# Altium schematic symbol library jlcpcb_2025_04_inductors_extended_0402.schlib: 1396 symbols (part 3 of 8) (continued)
## LQW15AN4N0C10D
designator L?  Inductance: 4nH
Inductor, 4nH, 51mΩ, SMD 0402; Manufacturer: Murata Electronics; Manufacturer Part Number: LQW15AN4N0C10D; Self-Resonant Frequency: 6.5GHz; Q Factor: 30@250MHz; Package Size: 0402; JLCPCB Basic Part: No; JLCPCB Part Number: C412345; Supplier 1: LCSC; Category: Inductors; Supplier Part Number 1: C412345; DC Resistance: 51mΩ; RoHS: Yes; ComponentLink1Description: Datasheet; ComponentLink1URL: https://wmsc.lcsc.com/wmsc/upload/file/pdf/v2/lcsc/2304140030_Murata-Electronics-LQW15AN4N0C10D_C412345.pdf; ComponentLink2Description: JLCPCB Part URL; ComponentLink2URL: https://jlcpcb.com/partdetail/C412345; ComponentLink3Description: LCSC Part URL; ComponentLink3URL: https://lcsc.com/product-detail/Inductors-SMD_Murata-Electronics-Murata-Electronics-LQW15AN4N0C10D_C412345.html
footprint IND-0402 (0402 (1005M) Inductor)
pins: 1, 2

## LQW15AN4N0G80D
designator L?  Inductance: 4nH
Inductor, 4nH, ±2%, 30mΩ, SMD 0402; Manufacturer: Murata Electronics; Manufacturer Part Number: LQW15AN4N0G80D; Self-Resonant Frequency: 10GHz; Q Factor: 30@250MHz; Package Size: 0402; JLCPCB Basic Part: No; JLCPCB Part Number: C412280; Supplier 1: LCSC; Category: Inductors; Supplier Part Number 1: C412280; Tolerance: ±2%; DC Resistance: 30mΩ; RoHS: Yes; ComponentLink1Description: Datasheet; ComponentLink1URL: https://wmsc.lcsc.com/wmsc/upload/file/pdf/v2/lcsc/2304140030_Murata-Electronics-LQW15AN4N0G80D_C412280.pdf; ComponentLink2Description: JLCPCB Part URL; ComponentLink2URL: https://jlcpcb.com/partdetail/C412280; ComponentLink3Description: LCSC Part URL; ComponentLink3URL: https://lcsc.com/product-detail/Inductors-SMD_Murata-Electronics-Murata-Electronics-LQW15AN4N0G80D_C412280.html
footprint IND-0402 (0402 (1005M) Inductor)
pins: 1, 2

## LQW15AN4N1B00D
designator L?  Inductance: 4.1nH
Inductor, 4.1nH, 70mΩ, SMD 0402; Manufacturer: Murata Electronics; Manufacturer Part Number: LQW15AN4N1B00D; Self-Resonant Frequency: 10GHz; Q Factor: 25@250MHz; Package Size: 0402; JLCPCB Basic Part: No; JLCPCB Part Number: C397302; Supplier 1: LCSC; Category: Inductors; Supplier Part Number 1: C397302; DC Resistance: 70mΩ; RoHS: Yes; ComponentLink1Description: Datasheet; ComponentLink1URL: https://wmsc.lcsc.com/wmsc/upload/file/pdf/v2/lcsc/2304140030_Murata-Electronics-LQW15AN4N1B00D_C397302.pdf; ComponentLink2Description: JLCPCB Part URL; ComponentLink2URL: https://jlcpcb.com/partdetail/C397302; ComponentLink3Description: LCSC Part URL; ComponentLink3URL: https://lcsc.com/product-detail/Inductors-SMD_Murata-Electronics-Murata-Electronics-LQW15AN4N1B00D_C397302.html
footprint IND-0402 (0402 (1005M) Inductor)
pins: 1, 2

## LQW15AN4N1G80D
designator L?  Inductance: 4.1nH
Inductor, 4.1nH, ±2%, 44mΩ, SMD 0402; Manufacturer: Murata Electronics; Manufacturer Part Number: LQW15AN4N1G80D; Self-Resonant Frequency: 9.6GHz; Q Factor: 30@250MHz; Package Size: 0402; JLCPCB Basic Part: No; JLCPCB Part Number: C412281; Supplier 1: LCSC; Category: Inductors; Supplier Part Number 1: C412281; Tolerance: ±2%; DC Resistance: 44mΩ; RoHS: Yes; ComponentLink1Description: Datasheet; ComponentLink1URL: https://wmsc.lcsc.com/wmsc/upload/file/pdf/v2/lcsc/2304140030_Murata-Electronics-LQW15AN4N1G80D_C412281.pdf; ComponentLink2Description: JLCPCB Part URL; ComponentLink2URL: https://jlcpcb.com/partdetail/C412281; ComponentLink3Description: LCSC Part URL; ComponentLink3URL: https://lcsc.com/product-detail/Inductors-SMD_Murata-Electronics-Murata-Electronics-LQW15AN4N1G80D_C412281.html
footprint IND-0402 (0402 (1005M) Inductor)
pins: 1, 2

## LQW15AN4N2C10D
designator L?  Inductance: 4.2nH
Inductor, 4.2nH, 51mΩ, SMD 0402; Manufacturer: Murata Electronics; Manufacturer Part Number: LQW15AN4N2C10D; Self-Resonant Frequency: 6.5GHz; Q Factor: 30@250MHz; Package Size: 0402; JLCPCB Basic Part: No; JLCPCB Part Number: C412346; Supplier 1: LCSC; Category: Inductors; Supplier Part Number 1: C412346; DC Resistance: 51mΩ; RoHS: Yes; ComponentLink1Description: Datasheet; ComponentLink1URL: https://wmsc.lcsc.com/wmsc/upload/file/pdf/v2/lcsc/2304140030_Murata-Electronics-LQW15AN4N2C10D_C412346.pdf; ComponentLink2Description: JLCPCB Part URL; ComponentLink2URL: https://jlcpcb.com/partdetail/C412346; ComponentLink3Description: LCSC Part URL; ComponentLink3URL: https://lcsc.com/product-detail/Inductors-SMD_Murata-Electronics-Murata-Electronics-LQW15AN4N2C10D_C412346.html
footprint IND-0402 (0402 (1005M) Inductor)
pins: 1, 2

## LQW15AN4N2D8ZD
designator L?  Inductance: 4.2nH
Inductor, 4.2nH, 44mΩ, 1.8A, SMD 0402; Manufacturer: Murata Electronics; Manufacturer Part Number: LQW15AN4N2D8ZD; Package Size: 0402; JLCPCB Basic Part: No; JLCPCB Part Number: C2043843; Supplier 1: LCSC; Category: Inductors; Supplier Part Number 1: C2043843; Rated Current: 1.8A; DC Resistance: 44mΩ; RoHS: Yes; ComponentLink1Description: Datasheet; ComponentLink1URL: https://wmsc.lcsc.com/wmsc/upload/file/pdf/v2/lcsc/2304140030_Murata-Electronics-LQW15AN4N2D8ZD_C2043843.pdf; ComponentLink2Description: JLCPCB Part URL; ComponentLink2URL: https://jlcpcb.com/partdetail/C2043843; ComponentLink3Description: LCSC Part URL; ComponentLink3URL: https://lcsc.com/product-detail/Power-Inductors_Murata-Electronics-Murata-Electronics-LQW15AN4N2D8ZD_C2043843.html
footprint IND-0402 (0402 (1005M) Inductor)
pins: 1, 2

## LQW15AN4N2G80D
designator L?  Inductance: 4.2nH
Inductor, 4.2nH, ±2%, 44mΩ, SMD 0402; Manufacturer: Murata Electronics; Manufacturer Part Number: LQW15AN4N2G80D; Self-Resonant Frequency: 9.6GHz; Q Factor: 30@250MHz; Package Size: 0402; JLCPCB Basic Part: No; JLCPCB Part Number: C412282; Supplier 1: LCSC; Category: Inductors; Supplier Part Number 1: C412282; Tolerance: ±2%; DC Resistance: 44mΩ; RoHS: Yes; ComponentLink1Description: Datasheet; ComponentLink1URL: https://wmsc.lcsc.com/wmsc/upload/file/pdf/v2/lcsc/2304140030_Murata-Electronics-LQW15AN4N2G80D_C412282.pdf; ComponentLink2Description: JLCPCB Part URL; ComponentLink2URL: https://jlcpcb.com/partdetail/C412282; ComponentLink3Description: LCSC Part URL; ComponentLink3URL: https://lcsc.com/product-detail/Inductors-SMD_Murata-Electronics-Murata-Electronics-LQW15AN4N2G80D_C412282.html
footprint IND-0402 (0402 (1005M) Inductor)
pins: 1, 2

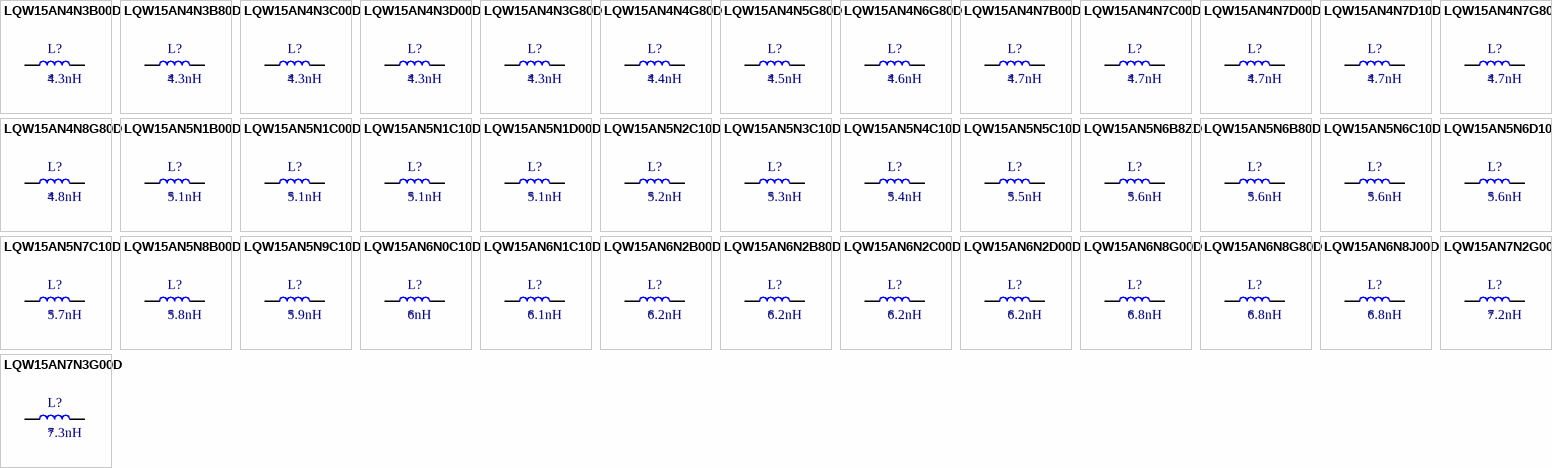
[diagram p13: symbols LQW15AN4N3B00D to LQW15AN7N3G00D]

## LQW15AN4N3B00D
designator L?  Inductance: 4.3nH
Inductor, 4.3nH, 70mΩ, 750mA, SMD 0402; Manufacturer: Murata Electronics; Manufacturer Part Number: LQW15AN4N3B00D; Self-Resonant Frequency: 10GHz; Q Factor: 25@250MHz; Package Size: 0402; JLCPCB Basic Part: No; JLCPCB Part Number: C91625; Supplier 1: LCSC; Category: Inductors; Supplier Part Number 1: C91625; Rated Current: 750mA; DC Resistance: 70mΩ; RoHS: Yes; ComponentLink1Description: Datasheet; ComponentLink1URL: https://wmsc.lcsc.com/wmsc/upload/file/pdf/v2/lcsc/1811081525_Murata-Electronics-LQW15AN4N3B00D_C91625.pdf; ComponentLink2Description: JLCPCB Part URL; ComponentLink2URL: https://jlcpcb.com/partdetail/C91625; ComponentLink3Description: LCSC Part URL; ComponentLink3URL: https://lcsc.com/product-detail/Inductors-SMD_Murata-Electronics-Murata-Electronics-LQW15AN4N3B00D_C91625.html
footprint IND-0402 (0402 (1005M) Inductor)
pins: 1, 2

## LQW15AN4N3B80D
designator L?  Inductance: 4.3nH
Inductor, 4.3nH, 44mΩ, 1.8A, SMD 0402; Manufacturer: Murata Electronics; Manufacturer Part Number: LQW15AN4N3B80D; Self-Resonant Frequency: 9.6GHz; Q Factor: 32@250MHz; Package Size: 0402; JLCPCB Basic Part: No; JLCPCB Part Number: C471381; Supplier 1: LCSC; Category: Inductors; Supplier Part Number 1: C471381; Rated Current: 1.8A; DC Resistance: 44mΩ; RoHS: Yes; ComponentLink1Description: Datasheet; ComponentLink1URL: https://wmsc.lcsc.com/wmsc/upload/file/pdf/v2/lcsc/2304140030_Murata-Electronics-LQW15AN4N3B80D_C471381.pdf; ComponentLink2Description: JLCPCB Part URL; ComponentLink2URL: https://jlcpcb.com/partdetail/C471381; ComponentLink3Description: LCSC Part URL; ComponentLink3URL: https://lcsc.com/product-detail/Inductors-SMD_Murata-Electronics-Murata-Electronics-LQW15AN4N3B80D_C471381.html
footprint IND-0402 (0402 (1005M) Inductor)
pins: 1, 2

## LQW15AN4N3C00D
designator L?  Inductance: 4.3nH
Inductor, 4.3nH, 70mΩ, 750mA, SMD 0402; Manufacturer: Murata Electronics; Manufacturer Part Number: LQW15AN4N3C00D; Self-Resonant Frequency: 10GHz; Q Factor: 25@250MHz; Package Size: 0402; JLCPCB Basic Part: No; JLCPCB Part Number: C113115; Supplier 1: LCSC; Category: Inductors; Supplier Part Number 1: C113115; Rated Current: 750mA; DC Resistance: 70mΩ; RoHS: Yes; ComponentLink1Description: Datasheet; ComponentLink1URL: https://wmsc.lcsc.com/wmsc/upload/file/pdf/v2/lcsc/2304140030_Murata-Electronics-LQW15AN4N3C00D_C113115.pdf; ComponentLink2Description: JLCPCB Part URL; ComponentLink2URL: https://jlcpcb.com/partdetail/C113115; ComponentLink3Description: LCSC Part URL; ComponentLink3URL: https://lcsc.com/product-detail/Inductors-SMD_Murata-Electronics-Murata-Electronics-LQW15AN4N3C00D_C113115.html
footprint IND-0402 (0402 (1005M) Inductor)
pins: 1, 2

## LQW15AN4N3D00D
designator L?  Inductance: 4.3nH
Inductor, 4.3nH, 70mΩ, 750mA, SMD 0402; Manufacturer: Murata Electronics; Manufacturer Part Number: LQW15AN4N3D00D; Package Size: 0402; JLCPCB Basic Part: No; JLCPCB Part Number: C913627; Supplier 1: LCSC; Category: Inductors; Supplier Part Number 1: C913627; Rated Current: 750mA; DC Resistance: 70mΩ; RoHS: Yes; ComponentLink1Description: Datasheet; ComponentLink1URL: https://wmsc.lcsc.com/wmsc/upload/file/pdf/v2/lcsc/2304140030_Murata-Electronics-LQW15AN4N3D00D_C913627.pdf; ComponentLink2Description: JLCPCB Part URL; ComponentLink2URL: https://jlcpcb.com/partdetail/C913627; ComponentLink3Description: LCSC Part URL; ComponentLink3URL: https://lcsc.com/product-detail/Power-Inductors_Murata-Electronics-Murata-Electronics-LQW15AN4N3D00D_C913627.html
footprint IND-0402 (0402 (1005M) Inductor)
pins: 1, 2

## LQW15AN4N3G80D
designator L?  Inductance: 4.3nH
Inductor, 4.3nH, ±2%, 44mΩ, SMD 0402; Manufacturer: Murata Electronics; Manufacturer Part Number: LQW15AN4N3G80D; Self-Resonant Frequency: 9.6GHz; Q Factor: 32@250MHz; Package Size: 0402; JLCPCB Basic Part: No; JLCPCB Part Number: C412333; Supplier 1: LCSC; Category: Inductors; Supplier Part Number 1: C412333; Tolerance: ±2%; DC Resistance: 44mΩ; RoHS: Yes; ComponentLink1Description: Datasheet; ComponentLink1URL: https://wmsc.lcsc.com/wmsc/upload/file/pdf/v2/lcsc/2304140030_Murata-Electronics-LQW15AN4N3G80D_C412333.pdf; ComponentLink2Description: JLCPCB Part URL; ComponentLink2URL: https://jlcpcb.com/partdetail/C412333; ComponentLink3Description: LCSC Part URL; ComponentLink3URL: https://lcsc.com/product-detail/Inductors-SMD_Murata-Electronics-Murata-Electronics-LQW15AN4N3G80D_C412333.html
footprint IND-0402 (0402 (1005M) Inductor)
pins: 1, 2

## LQW15AN4N4G80D
designator L?  Inductance: 4.4nH
Inductor, 4.4nH, ±2%, 52mΩ, SMD 0402; Manufacturer: Murata Electronics; Manufacturer Part Number: LQW15AN4N4G80D; Self-Resonant Frequency: 9.6GHz; Q Factor: 34@250MHz; Package Size: 0402; JLCPCB Basic Part: No; JLCPCB Part Number: C412334; Supplier 1: LCSC; Category: Inductors; Supplier Part Number 1: C412334; Tolerance: ±2%; DC Resistance: 52mΩ; RoHS: Yes; ComponentLink1Description: Datasheet; ComponentLink1URL: https://wmsc.lcsc.com/wmsc/upload/file/pdf/v2/lcsc/2304140030_Murata-Electronics-LQW15AN4N4G80D_C412334.pdf; ComponentLink2Description: JLCPCB Part URL; ComponentLink2URL: https://jlcpcb.com/partdetail/C412334; ComponentLink3Description: LCSC Part URL; ComponentLink3URL: https://lcsc.com/product-detail/Inductors-SMD_Murata-Electronics-Murata-Electronics-LQW15AN4N4G80D_C412334.html
footprint IND-0402 (0402 (1005M) Inductor)
pins: 1, 2

## LQW15AN4N5G80D
designator L?  Inductance: 4.5nH
Inductor, 4.5nH, ±2%, 60mΩ, SMD 0402; Manufacturer: Murata Electronics; Manufacturer Part Number: LQW15AN4N5G80D; Self-Resonant Frequency: 9.6GHz; Q Factor: 34@250MHz; Package Size: 0402; JLCPCB Basic Part: No; JLCPCB Part Number: C412335; Supplier 1: LCSC; Category: Inductors; Supplier Part Number 1: C412335; Tolerance: ±2%; DC Resistance: 60mΩ; RoHS: Yes; ComponentLink1Description: Datasheet; ComponentLink1URL: https://wmsc.lcsc.com/wmsc/upload/file/pdf/v2/lcsc/2304140030_Murata-Electronics-LQW15AN4N5G80D_C412335.pdf; ComponentLink2Description: JLCPCB Part URL; ComponentLink2URL: https://jlcpcb.com/partdetail/C412335; ComponentLink3Description: LCSC Part URL; ComponentLink3URL: https://lcsc.com/product-detail/Inductors-SMD_Murata-Electronics-Murata-Electronics-LQW15AN4N5G80D_C412335.html
footprint IND-0402 (0402 (1005M) Inductor)
pins: 1, 2

## LQW15AN4N6G80D
designator L?  Inductance: 4.6nH
Inductor, 4.6nH, ±2%, 60mΩ, SMD 0402; Manufacturer: Murata Electronics; Manufacturer Part Number: LQW15AN4N6G80D; Self-Resonant Frequency: 9.6GHz; Q Factor: 32@250MHz; Package Size: 0402; JLCPCB Basic Part: No; JLCPCB Part Number: C412336; Supplier 1: LCSC; Category: Inductors; Supplier Part Number 1: C412336; Tolerance: ±2%; DC Resistance: 60mΩ; RoHS: Yes; ComponentLink1Description: Datasheet; ComponentLink1URL: https://wmsc.lcsc.com/wmsc/upload/file/pdf/v2/lcsc/2304140030_Murata-Electronics-LQW15AN4N6G80D_C412336.pdf; ComponentLink2Description: JLCPCB Part URL; ComponentLink2URL: https://jlcpcb.com/partdetail/C412336; ComponentLink3Description: LCSC Part URL; ComponentLink3URL: https://lcsc.com/product-detail/Inductors-SMD_Murata-Electronics-Murata-Electronics-LQW15AN4N6G80D_C412336.html
footprint IND-0402 (0402 (1005M) Inductor)
pins: 1, 2

## LQW15AN4N7B00D
designator L?  Inductance: 4.7nH
Inductor, 4.7nH, 70mΩ, 750mA, SMD 0402; Manufacturer: Murata Electronics; Manufacturer Part Number: LQW15AN4N7B00D; Self-Resonant Frequency: 8GHz; Q Factor: 25@250MHz; Package Size: 0402; JLCPCB Basic Part: No; JLCPCB Part Number: C98064; Supplier 1: LCSC; Category: Inductors; Supplier Part Number 1: C98064; Rated Current: 750mA; DC Resistance: 70mΩ; RoHS: Yes; ComponentLink1Description: Datasheet; ComponentLink1URL: https://wmsc.lcsc.com/wmsc/upload/file/pdf/v2/lcsc/2304140030_Murata-Electronics-LQW15AN4N7B00D_C98064.pdf; ComponentLink2Description: JLCPCB Part URL; ComponentLink2URL: https://jlcpcb.com/partdetail/C98064; ComponentLink3Description: LCSC Part URL; ComponentLink3URL: https://lcsc.com/product-detail/Inductors-SMD_Murata-Electronics-Murata-Electronics-LQW15AN4N7B00D_C98064.html
footprint IND-0402 (0402 (1005M) Inductor)
pins: 1, 2

## LQW15AN4N7C00D
designator L?  Inductance: 4.7nH
Inductor, 4.7nH, 70mΩ, SMD 0402; Manufacturer: Murata Electronics; Manufacturer Part Number: LQW15AN4N7C00D; Self-Resonant Frequency: 8GHz; Q Factor: 25@250MHz; Package Size: 0402; JLCPCB Basic Part: No; JLCPCB Part Number: C167480; Supplier 1: LCSC; Category: Inductors; Supplier Part Number 1: C167480; DC Resistance: 70mΩ; RoHS: Yes; ComponentLink1Description: Datasheet; ComponentLink1URL: https://wmsc.lcsc.com/wmsc/upload/file/pdf/v2/lcsc/2304140030_Murata-Electronics-LQW15AN4N7C00D_C167480.pdf; ComponentLink2Description: JLCPCB Part URL; ComponentLink2URL: https://jlcpcb.com/partdetail/C167480; ComponentLink3Description: LCSC Part URL; ComponentLink3URL: https://lcsc.com/product-detail/Inductors-SMD_Murata-Electronics-Murata-Electronics-LQW15AN4N7C00D_C167480.html
footprint IND-0402 (0402 (1005M) Inductor)
pins: 1, 2

## LQW15AN4N7D00D
designator L?  Inductance: 4.7nH
Inductor, 4.7nH, 70mΩ, 750mA, SMD 0402; Manufacturer: Murata Electronics; Manufacturer Part Number: LQW15AN4N7D00D; Self-Resonant Frequency: 8GHz; Q Factor: 25@250MHz; Package Size: 0402; JLCPCB Basic Part: No; JLCPCB Part Number: C167481; Supplier 1: LCSC; Category: Inductors; Supplier Part Number 1: C167481; Rated Current: 750mA; DC Resistance: 70mΩ; RoHS: Yes; ComponentLink1Description: Datasheet; ComponentLink1URL: https://wmsc.lcsc.com/wmsc/upload/file/pdf/v2/lcsc/2304140030_Murata-Electronics-LQW15AN4N7D00D_C167481.pdf; ComponentLink2Description: JLCPCB Part URL; ComponentLink2URL: https://jlcpcb.com/partdetail/C167481; ComponentLink3Description: LCSC Part URL; ComponentLink3URL: https://lcsc.com/product-detail/Inductors-SMD_Murata-Electronics-Murata-Electronics-LQW15AN4N7D00D_C167481.html
footprint IND-0402 (0402 (1005M) Inductor)
pins: 1, 2

## LQW15AN4N7D10D
designator L?  Inductance: 4.7nH
Inductor, 4.7nH, 51mΩ, 800mA, SMD 0402; Manufacturer: Murata Electronics; Manufacturer Part Number: LQW15AN4N7D10D; Self-Resonant Frequency: 8GHz; Q Factor: 30@250MHz; Package Size: 0402; JLCPCB Basic Part: No; JLCPCB Part Number: C341688; Supplier 1: LCSC; Category: Inductors; Supplier Part Number 1: C341688; Rated Current: 800mA; DC Resistance: 51mΩ; RoHS: Yes; ComponentLink1Description: Datasheet; ComponentLink1URL: https://wmsc.lcsc.com/wmsc/upload/file/pdf/v2/lcsc/2304140030_Murata-Electronics-LQW15AN4N7D10D_C341688.pdf; ComponentLink2Description: JLCPCB Part URL; ComponentLink2URL: https://jlcpcb.com/partdetail/C341688; ComponentLink3Description: LCSC Part URL; ComponentLink3URL: https://lcsc.com/product-detail/Inductors-SMD_Murata-Electronics-Murata-Electronics-LQW15AN4N7D10D_C341688.html
footprint IND-0402 (0402 (1005M) Inductor)
pins: 1, 2

## LQW15AN4N7G80D
designator L?  Inductance: 4.7nH
Inductor, 4.7nH, ±2%, 71mΩ, SMD 0402; Manufacturer: Murata Electronics; Manufacturer Part Number: LQW15AN4N7G80D; Self-Resonant Frequency: 8GHz; Q Factor: 31@250MHz; Package Size: 0402; JLCPCB Basic Part: No; JLCPCB Part Number: C412337; Supplier 1: LCSC; Category: Inductors; Supplier Part Number 1: C412337; Tolerance: ±2%; DC Resistance: 71mΩ; RoHS: Yes; ComponentLink1Description: Datasheet; ComponentLink1URL: https://wmsc.lcsc.com/wmsc/upload/file/pdf/v2/lcsc/2304140030_Murata-Electronics-LQW15AN4N7G80D_C412337.pdf; ComponentLink2Description: JLCPCB Part URL; ComponentLink2URL: https://jlcpcb.com/partdetail/C412337; ComponentLink3Description: LCSC Part URL; ComponentLink3URL: https://lcsc.com/product-detail/Inductors-SMD_Murata-Electronics-Murata-Electronics-LQW15AN4N7G80D_C412337.html
footprint IND-0402 (0402 (1005M) Inductor)
pins: 1, 2

## LQW15AN4N8G80D
designator L?  Inductance: 4.8nH
Inductor, 4.8nH, ±2%, 71mΩ, SMD 0402; Manufacturer: Murata Electronics; Manufacturer Part Number: LQW15AN4N8G80D; Self-Resonant Frequency: 8GHz; Q Factor: 30@250MHz; Package Size: 0402; JLCPCB Basic Part: No; JLCPCB Part Number: C412338; Supplier 1: LCSC; Category: Inductors; Supplier Part Number 1: C412338; Tolerance: ±2%; DC Resistance: 71mΩ; RoHS: Yes; ComponentLink1Description: Datasheet; ComponentLink1URL: https://wmsc.lcsc.com/wmsc/upload/file/pdf/v2/lcsc/2304140030_Murata-Electronics-LQW15AN4N8G80D_C412338.pdf; ComponentLink2Description: JLCPCB Part URL; ComponentLink2URL: https://jlcpcb.com/partdetail/C412338; ComponentLink3Description: LCSC Part URL; ComponentLink3URL: https://lcsc.com/product-detail/Inductors-SMD_Murata-Electronics-Murata-Electronics-LQW15AN4N8G80D_C412338.html
footprint IND-0402 (0402 (1005M) Inductor)
pins: 1, 2

## LQW15AN5N1B00D
designator L?  Inductance: 5.1nH
Inductor, 5.1nH, 120mΩ, SMD 0402; Manufacturer: Murata Electronics; Manufacturer Part Number: LQW15AN5N1B00D; Self-Resonant Frequency: 8GHz; Q Factor: 25@250MHz; Package Size: 0402; JLCPCB Basic Part: No; JLCPCB Part Number: C408161; Supplier 1: LCSC; Category: Inductors; Supplier Part Number 1: C408161; DC Resistance: 120mΩ; RoHS: Yes; ComponentLink1Description: Datasheet; ComponentLink1URL: https://wmsc.lcsc.com/wmsc/upload/file/pdf/v2/lcsc/2304140030_Murata-Electronics-LQW15AN5N1B00D_C408161.pdf; ComponentLink2Description: JLCPCB Part URL; ComponentLink2URL: https://jlcpcb.com/partdetail/C408161; ComponentLink3Description: LCSC Part URL; ComponentLink3URL: https://lcsc.com/product-detail/Inductors-SMD_Murata-Electronics-Murata-Electronics-LQW15AN5N1B00D_C408161.html
footprint IND-0402 (0402 (1005M) Inductor)
pins: 1, 2

## LQW15AN5N1C00D
designator L?  Inductance: 5.1nH
Inductor, 5.1nH, 120mΩ, 600mA, SMD 0402; Manufacturer: Murata Electronics; Manufacturer Part Number: LQW15AN5N1C00D; Self-Resonant Frequency: 8GHz; Q Factor: 25@250MHz; Package Size: 0402; JLCPCB Basic Part: No; JLCPCB Part Number: C113117; Supplier 1: LCSC; Category: Inductors; Supplier Part Number 1: C113117; Rated Current: 600mA; DC Resistance: 120mΩ; RoHS: Yes; ComponentLink1Description: Datasheet; ComponentLink1URL: https://wmsc.lcsc.com/wmsc/upload/file/pdf/v2/lcsc/2304140030_Murata-Electronics-LQW15AN5N1C00D_C113117.pdf; ComponentLink2Description: JLCPCB Part URL; ComponentLink2URL: https://jlcpcb.com/partdetail/C113117; ComponentLink3Description: LCSC Part URL; ComponentLink3URL: https://lcsc.com/product-detail/Inductors-SMD_Murata-Electronics-Murata-Electronics-LQW15AN5N1C00D_C113117.html
footprint IND-0402 (0402 (1005M) Inductor)
pins: 1, 2

## LQW15AN5N1C10D
designator L?  Inductance: 5.1nH
Inductor, 5.1nH, 51mΩ, SMD 0402; Manufacturer: Murata Electronics; Manufacturer Part Number: LQW15AN5N1C10D; Self-Resonant Frequency: 8GHz; Q Factor: 30@250MHz; Package Size: 0402; JLCPCB Basic Part: No; JLCPCB Part Number: C412347; Supplier 1: LCSC; Category: Inductors; Supplier Part Number 1: C412347; DC Resistance: 51mΩ; RoHS: Yes; ComponentLink1Description: Datasheet; ComponentLink1URL: https://wmsc.lcsc.com/wmsc/upload/file/pdf/v2/lcsc/2304140030_Murata-Electronics-LQW15AN5N1C10D_C412347.pdf; ComponentLink2Description: JLCPCB Part URL; ComponentLink2URL: https://jlcpcb.com/partdetail/C412347; ComponentLink3Description: LCSC Part URL; ComponentLink3URL: https://lcsc.com/product-detail/Inductors-SMD_Murata-Electronics-Murata-Electronics-LQW15AN5N1C10D_C412347.html
footprint IND-0402 (0402 (1005M) Inductor)
pins: 1, 2

## LQW15AN5N1D00D
designator L?  Inductance: 5.1nH
Inductor, 5.1nH, 120mΩ, 600mA, SMD 0402; Manufacturer: Murata Electronics; Manufacturer Part Number: LQW15AN5N1D00D; Package Size: 0402; JLCPCB Basic Part: No; JLCPCB Part Number: C269826; Supplier 1: LCSC; Category: Inductors; Supplier Part Number 1: C269826; Rated Current: 600mA; DC Resistance: 120mΩ; RoHS: Yes; ComponentLink1Description: Datasheet; ComponentLink1URL: https://wmsc.lcsc.com/wmsc/upload/file/pdf/v2/lcsc/2308111549_Murata-Electronics-LQW15AN5N1D00D_C269826.pdf; ComponentLink2Description: JLCPCB Part URL; ComponentLink2URL: https://jlcpcb.com/partdetail/C269826; ComponentLink3Description: LCSC Part URL; ComponentLink3URL: https://lcsc.com/product-detail/Power-Inductors_Murata-Electronics-Murata-Electronics-LQW15AN5N1D00D_C269826.html
footprint IND-0402 (0402 (1005M) Inductor)
pins: 1, 2

## LQW15AN5N2C10D
designator L?  Inductance: 5.2nH
Inductor, 5.2nH, 51mΩ, SMD 0402; Manufacturer: Murata Electronics; Manufacturer Part Number: LQW15AN5N2C10D; Self-Resonant Frequency: 8GHz; Q Factor: 30@250MHz; Package Size: 0402; JLCPCB Basic Part: No; JLCPCB Part Number: C412348; Supplier 1: LCSC; Category: Inductors; Supplier Part Number 1: C412348; DC Resistance: 51mΩ; RoHS: Yes; ComponentLink1Description: Datasheet; ComponentLink1URL: https://wmsc.lcsc.com/wmsc/upload/file/pdf/v2/lcsc/2304140030_Murata-Electronics-LQW15AN5N2C10D_C412348.pdf; ComponentLink2Description: JLCPCB Part URL; ComponentLink2URL: https://jlcpcb.com/partdetail/C412348; ComponentLink3Description: LCSC Part URL; ComponentLink3URL: https://lcsc.com/product-detail/Inductors-SMD_Murata-Electronics-Murata-Electronics-LQW15AN5N2C10D_C412348.html
footprint IND-0402 (0402 (1005M) Inductor)
pins: 1, 2

## LQW15AN5N3C10D
designator L?  Inductance: 5.3nH
Inductor, 5.3nH, 51mΩ, SMD 0402; Manufacturer: Murata Electronics; Manufacturer Part Number: LQW15AN5N3C10D; Self-Resonant Frequency: 8GHz; Q Factor: 30@250MHz; Package Size: 0402; JLCPCB Basic Part: No; JLCPCB Part Number: C412349; Supplier 1: LCSC; Category: Inductors; Supplier Part Number 1: C412349; DC Resistance: 51mΩ; RoHS: Yes; ComponentLink1Description: Datasheet; ComponentLink1URL: https://wmsc.lcsc.com/wmsc/upload/file/pdf/v2/lcsc/2304140030_Murata-Electronics-LQW15AN5N3C10D_C412349.pdf; ComponentLink2Description: JLCPCB Part URL; ComponentLink2URL: https://jlcpcb.com/partdetail/C412349; ComponentLink3Description: LCSC Part URL; ComponentLink3URL: https://lcsc.com/product-detail/Inductors-SMD_Murata-Electronics-Murata-Electronics-LQW15AN5N3C10D_C412349.html
footprint IND-0402 (0402 (1005M) Inductor)
pins: 1, 2

## LQW15AN5N4C10D
designator L?  Inductance: 5.4nH
Inductor, 5.4nH, 51mΩ, SMD 0402; Manufacturer: Murata Electronics; Manufacturer Part Number: LQW15AN5N4C10D; Self-Resonant Frequency: 8GHz; Q Factor: 30@250MHz; Package Size: 0402; JLCPCB Basic Part: No; JLCPCB Part Number: C412350; Supplier 1: LCSC; Category: Inductors; Supplier Part Number 1: C412350; DC Resistance: 51mΩ; RoHS: Yes; ComponentLink1Description: Datasheet; ComponentLink1URL: https://wmsc.lcsc.com/wmsc/upload/file/pdf/v2/lcsc/2304140030_Murata-Electronics-LQW15AN5N4C10D_C412350.pdf; ComponentLink2Description: JLCPCB Part URL; ComponentLink2URL: https://jlcpcb.com/partdetail/C412350; ComponentLink3Description: LCSC Part URL; ComponentLink3URL: https://lcsc.com/product-detail/Inductors-SMD_Murata-Electronics-Murata-Electronics-LQW15AN5N4C10D_C412350.html
footprint IND-0402 (0402 (1005M) Inductor)
pins: 1, 2

## LQW15AN5N5C10D
designator L?  Inductance: 5.5nH
Inductor, 5.5nH, 51mΩ, SMD 0402; Manufacturer: Murata Electronics; Manufacturer Part Number: LQW15AN5N5C10D; Self-Resonant Frequency: 8GHz; Q Factor: 30@250MHz; Package Size: 0402; JLCPCB Basic Part: No; JLCPCB Part Number: C412351; Supplier 1: LCSC; Category: Inductors; Supplier Part Number 1: C412351; DC Resistance: 51mΩ; RoHS: Yes; ComponentLink1Description: Datasheet; ComponentLink1URL: https://wmsc.lcsc.com/wmsc/upload/file/pdf/v2/lcsc/2304140030_Murata-Electronics-LQW15AN5N5C10D_C412351.pdf; ComponentLink2Description: JLCPCB Part URL; ComponentLink2URL: https://jlcpcb.com/partdetail/C412351; ComponentLink3Description: LCSC Part URL; ComponentLink3URL: https://lcsc.com/product-detail/Inductors-SMD_Murata-Electronics-Murata-Electronics-LQW15AN5N5C10D_C412351.html
footprint IND-0402 (0402 (1005M) Inductor)
pins: 1, 2

## LQW15AN5N6B8ZD
designator L?  Inductance: 5.6nH
Inductor, 5.6nH, 40mΩ, 1.77A, SMD 0402; Manufacturer: Murata Electronics; Manufacturer Part Number: LQW15AN5N6B8ZD; Package Size: 0402; JLCPCB Basic Part: No; JLCPCB Part Number: C527593; Supplier 1: LCSC; Category: Inductors; Supplier Part Number 1: C527593; Rated Current: 1.77A; DC Resistance: 40mΩ; RoHS: Yes; ComponentLink1Description: Datasheet; ComponentLink1URL: https://wmsc.lcsc.com/wmsc/upload/file/pdf/v2/lcsc/2304140030_Murata-Electronics-LQW15AN5N6B8ZD_C527593.pdf; ComponentLink2Description: JLCPCB Part URL; ComponentLink2URL: https://jlcpcb.com/partdetail/C527593; ComponentLink3Description: LCSC Part URL; ComponentLink3URL: https://lcsc.com/product-detail/Power-Inductors_Murata-Electronics-Murata-Electronics-LQW15AN5N6B8ZD_C527593.html
footprint IND-0402 (0402 (1005M) Inductor)
pins: 1, 2

## LQW15AN5N6B80D
designator L?  Inductance: 5.6nH
Inductor, 5.6nH, 40mΩ, 1.77A, SMD 0402; Manufacturer: Murata Electronics; Manufacturer Part Number: LQW15AN5N6B80D; Self-Resonant Frequency: 8GHz; Q Factor: 35@250MHz; Package Size: 0402; JLCPCB Basic Part: No; JLCPCB Part Number: C464439; Supplier 1: LCSC; Category: Inductors; Supplier Part Number 1: C464439; Rated Current: 1.77A; DC Resistance: 40mΩ; RoHS: Yes; ComponentLink1Description: Datasheet; ComponentLink1URL: https://wmsc.lcsc.com/wmsc/upload/file/pdf/v2/lcsc/1912111437_Murata-Electronics-LQW15AN5N6B80D_C464439.pdf; ComponentLink2Description: JLCPCB Part URL; ComponentLink2URL: https://jlcpcb.com/partdetail/C464439; ComponentLink3Description: LCSC Part URL; ComponentLink3URL: https://lcsc.com/product-detail/Inductors-SMD_Murata-Electronics-Murata-Electronics-LQW15AN5N6B80D_C464439.html
footprint IND-0402 (0402 (1005M) Inductor)
pins: 1, 2

## LQW15AN5N6C10D
designator L?  Inductance: 5.6nH
Inductor, 5.6nH, 51mΩ, 800mA, SMD 0402; Manufacturer: Murata Electronics; Manufacturer Part Number: LQW15AN5N6C10D; Self-Resonant Frequency: 8GHz; Q Factor: 30@250MHz; Package Size: 0402; JLCPCB Basic Part: No; JLCPCB Part Number: C91626; Supplier 1: LCSC; Category: Inductors; Supplier Part Number 1: C91626; Rated Current: 800mA; DC Resistance: 51mΩ; RoHS: Yes; ComponentLink1Description: Datasheet; ComponentLink1URL: https://wmsc.lcsc.com/wmsc/upload/file/pdf/v2/lcsc/1811081522_Murata-Electronics-LQW15AN5N6C10D_C91626.pdf; ComponentLink2Description: JLCPCB Part URL; ComponentLink2URL: https://jlcpcb.com/partdetail/C91626; ComponentLink3Description: LCSC Part URL; ComponentLink3URL: https://lcsc.com/product-detail/Inductors-SMD_Murata-Electronics-Murata-Electronics-LQW15AN5N6C10D_C91626.html
footprint IND-0402 (0402 (1005M) Inductor)
pins: 1, 2

## LQW15AN5N6D10D
designator L?  Inductance: 5.6nH
Inductor, 5.6nH, 51mΩ, 800mA, SMD 0402; Manufacturer: Murata Electronics; Manufacturer Part Number: LQW15AN5N6D10D; Package Size: 0402; JLCPCB Basic Part: No; JLCPCB Part Number: C711583; Supplier 1: LCSC; Category: Inductors; Supplier Part Number 1: C711583; Rated Current: 800mA; DC Resistance: 51mΩ; RoHS: Yes; ComponentLink1Description: Datasheet; ComponentLink1URL: https://wmsc.lcsc.com/wmsc/upload/file/pdf/v2/lcsc/2304140030_Murata-Electronics-LQW15AN5N6D10D_C711583.pdf; ComponentLink2Description: JLCPCB Part URL; ComponentLink2URL: https://jlcpcb.com/partdetail/C711583; ComponentLink3Description: LCSC Part URL; ComponentLink3URL: https://lcsc.com/product-detail/Power-Inductors_Murata-Electronics-Murata-Electronics-LQW15AN5N6D10D_C711583.html
footprint IND-0402 (0402 (1005M) Inductor)
pins: 1, 2

## LQW15AN5N7C10D
designator L?  Inductance: 5.7nH
Inductor, 5.7nH, 51mΩ, SMD 0402; Manufacturer: Murata Electronics; Manufacturer Part Number: LQW15AN5N7C10D; Self-Resonant Frequency: 8GHz; Q Factor: 30@250MHz; Package Size: 0402; JLCPCB Basic Part: No; JLCPCB Part Number: C412352; Supplier 1: LCSC; Category: Inductors; Supplier Part Number 1: C412352; DC Resistance: 51mΩ; RoHS: Yes; ComponentLink1Description: Datasheet; ComponentLink1URL: https://wmsc.lcsc.com/wmsc/upload/file/pdf/v2/lcsc/2304140030_Murata-Electronics-LQW15AN5N7C10D_C412352.pdf; ComponentLink2Description: JLCPCB Part URL; ComponentLink2URL: https://jlcpcb.com/partdetail/C412352; ComponentLink3Description: LCSC Part URL; ComponentLink3URL: https://lcsc.com/product-detail/Inductors-SMD_Murata-Electronics-Murata-Electronics-LQW15AN5N7C10D_C412352.html
footprint IND-0402 (0402 (1005M) Inductor)
pins: 1, 2

## LQW15AN5N8B00D
designator L?  Inductance: 5.8nH
Inductor, 5.8nH, 90mΩ, 700mA, SMD 0402; Manufacturer: Murata Electronics; Manufacturer Part Number: LQW15AN5N8B00D; Package Size: 0402; JLCPCB Basic Part: No; JLCPCB Part Number: C576549; Supplier 1: LCSC; Category: Inductors; Supplier Part Number 1: C576549; Rated Current: 700mA; DC Resistance: 90mΩ; RoHS: Yes; ComponentLink1Description: Datasheet; ComponentLink1URL: https://wmsc.lcsc.com/wmsc/upload/file/pdf/v2/lcsc/2304140030_Murata-Electronics-LQW15AN5N8B00D_C576549.pdf; ComponentLink2Description: JLCPCB Part URL; ComponentLink2URL: https://jlcpcb.com/partdetail/C576549; ComponentLink3Description: LCSC Part URL; ComponentLink3URL: https://lcsc.com/product-detail/Power-Inductors_Murata-Electronics-Murata-Electronics-LQW15AN5N8B00D_C576549.html
footprint IND-0402 (0402 (1005M) Inductor)
pins: 1, 2

## LQW15AN5N9C10D
designator L?  Inductance: 5.9nH
Inductor, 5.9nH, 56mΩ, SMD 0402; Manufacturer: Murata Electronics; Manufacturer Part Number: LQW15AN5N9C10D; Self-Resonant Frequency: 7.7GHz; Q Factor: 30@250MHz; Package Size: 0402; JLCPCB Basic Part: No; JLCPCB Part Number: C412353; Supplier 1: LCSC; Category: Inductors; Supplier Part Number 1: C412353; DC Resistance: 56mΩ; RoHS: Yes; ComponentLink1Description: Datasheet; ComponentLink1URL: https://wmsc.lcsc.com/wmsc/upload/file/pdf/v2/lcsc/2304140030_Murata-Electronics-LQW15AN5N9C10D_C412353.pdf; ComponentLink2Description: JLCPCB Part URL; ComponentLink2URL: https://jlcpcb.com/partdetail/C412353; ComponentLink3Description: LCSC Part URL; ComponentLink3URL: https://lcsc.com/product-detail/Inductors-SMD_Murata-Electronics-Murata-Electronics-LQW15AN5N9C10D_C412353.html
footprint IND-0402 (0402 (1005M) Inductor)
pins: 1, 2

## LQW15AN6N0C10D
designator L?  Inductance: 6nH
Inductor, 6nH, 56mΩ, SMD 0402; Manufacturer: Murata Electronics; Manufacturer Part Number: LQW15AN6N0C10D; Self-Resonant Frequency: 7.7GHz; Q Factor: 30@250MHz; Package Size: 0402; JLCPCB Basic Part: No; JLCPCB Part Number: C412354; Supplier 1: LCSC; Category: Inductors; Supplier Part Number 1: C412354; DC Resistance: 56mΩ; RoHS: Yes; ComponentLink1Description: Datasheet; ComponentLink1URL: https://wmsc.lcsc.com/wmsc/upload/file/pdf/v2/lcsc/2304140030_Murata-Electronics-LQW15AN6N0C10D_C412354.pdf; ComponentLink2Description: JLCPCB Part URL; ComponentLink2URL: https://jlcpcb.com/partdetail/C412354; ComponentLink3Description: LCSC Part URL; ComponentLink3URL: https://lcsc.com/product-detail/Inductors-SMD_Murata-Electronics-Murata-Electronics-LQW15AN6N0C10D_C412354.html
footprint IND-0402 (0402 (1005M) Inductor)
pins: 1, 2

## LQW15AN6N1C10D
designator L?  Inductance: 6.1nH
Inductor, 6.1nH, 56mΩ, SMD 0402; Manufacturer: Murata Electronics; Manufacturer Part Number: LQW15AN6N1C10D; Self-Resonant Frequency: 7.7GHz; Q Factor: 30@250MHz; Package Size: 0402; JLCPCB Basic Part: No; JLCPCB Part Number: C412355; Supplier 1: LCSC; Category: Inductors; Supplier Part Number 1: C412355; DC Resistance: 56mΩ; RoHS: Yes; ComponentLink1Description: Datasheet; ComponentLink1URL: https://wmsc.lcsc.com/wmsc/upload/file/pdf/v2/lcsc/2304140030_Murata-Electronics-LQW15AN6N1C10D_C412355.pdf; ComponentLink2Description: JLCPCB Part URL; ComponentLink2URL: https://jlcpcb.com/partdetail/C412355; ComponentLink3Description: LCSC Part URL; ComponentLink3URL: https://lcsc.com/product-detail/Inductors-SMD_Murata-Electronics-Murata-Electronics-LQW15AN6N1C10D_C412355.html
footprint IND-0402 (0402 (1005M) Inductor)
pins: 1, 2

## LQW15AN6N2B00D
designator L?  Inductance: 6.2nH
Inductor, 6.2nH, 90mΩ, 700mA, SMD 0402; Manufacturer: Murata Electronics; Manufacturer Part Number: LQW15AN6N2B00D; Self-Resonant Frequency: 8GHz; Q Factor: 25@250MHz; Package Size: 0402; JLCPCB Basic Part: No; JLCPCB Part Number: C91627; Supplier 1: LCSC; Category: Inductors; Supplier Part Number 1: C91627; Rated Current: 700mA; DC Resistance: 90mΩ; RoHS: Yes; ComponentLink1Description: Datasheet; ComponentLink1URL: https://wmsc.lcsc.com/wmsc/upload/file/pdf/v2/lcsc/1811081525_Murata-Electronics-LQW15AN6N2B00D_C91627.pdf; ComponentLink2Description: JLCPCB Part URL; ComponentLink2URL: https://jlcpcb.com/partdetail/C91627; ComponentLink3Description: LCSC Part URL; ComponentLink3URL: https://lcsc.com/product-detail/Inductors-SMD_Murata-Electronics-Murata-Electronics-LQW15AN6N2B00D_C91627.html
footprint IND-0402 (0402 (1005M) Inductor)
pins: 1, 2

## LQW15AN6N2B80D
designator L?  Inductance: 6.2nH
Inductor, 6.2nH, 56mΩ, 1.6A, SMD 0402; Manufacturer: Murata Electronics; Manufacturer Part Number: LQW15AN6N2B80D; Self-Resonant Frequency: 8GHz; Q Factor: 33@250MHz; Package Size: 0402; JLCPCB Basic Part: No; JLCPCB Part Number: C668465; Supplier 1: LCSC; Category: Inductors; Supplier Part Number 1: C668465; Rated Current: 1.6A; DC Resistance: 56mΩ; RoHS: Yes; ComponentLink1Description: Datasheet; ComponentLink1URL: https://wmsc.lcsc.com/wmsc/upload/file/pdf/v2/lcsc/2304140030_Murata-Electronics-LQW15AN6N2B80D_C668465.pdf; ComponentLink2Description: JLCPCB Part URL; ComponentLink2URL: https://jlcpcb.com/partdetail/C668465; ComponentLink3Description: LCSC Part URL; ComponentLink3URL: https://lcsc.com/product-detail/Inductors-SMD_Murata-Electronics-Murata-Electronics-LQW15AN6N2B80D_C668465.html
footprint IND-0402 (0402 (1005M) Inductor)
pins: 1, 2

## LQW15AN6N2C00D
designator L?  Inductance: 6.2nH
Inductor, 6.2nH, 90mΩ, SMD 0402; Manufacturer: Murata Electronics; Manufacturer Part Number: LQW15AN6N2C00D; Self-Resonant Frequency: 8GHz; Q Factor: 25@250MHz; Package Size: 0402; JLCPCB Basic Part: No; JLCPCB Part Number: C113118; Supplier 1: LCSC; Category: Inductors; Supplier Part Number 1: C113118; DC Resistance: 90mΩ; RoHS: Yes; ComponentLink1Description: Datasheet; ComponentLink1URL: https://wmsc.lcsc.com/wmsc/upload/file/pdf/v2/lcsc/2304140030_Murata-Electronics-LQW15AN6N2C00D_C113118.pdf; ComponentLink2Description: JLCPCB Part URL; ComponentLink2URL: https://jlcpcb.com/partdetail/C113118; ComponentLink3Description: LCSC Part URL; ComponentLink3URL: https://lcsc.com/product-detail/Inductors-SMD_Murata-Electronics-Murata-Electronics-LQW15AN6N2C00D_C113118.html
footprint IND-0402 (0402 (1005M) Inductor)
pins: 1, 2

## LQW15AN6N2D00D
designator L?  Inductance: 6.2nH
Inductor, 6.2nH, 90mΩ, 700mA, SMD 0402; Manufacturer: Murata Electronics; Manufacturer Part Number: LQW15AN6N2D00D; Package Size: 0402; JLCPCB Basic Part: No; JLCPCB Part Number: C703118; Supplier 1: LCSC; Category: Inductors; Supplier Part Number 1: C703118; Rated Current: 700mA; DC Resistance: 90mΩ; RoHS: Yes; ComponentLink1Description: Datasheet; ComponentLink1URL: https://wmsc.lcsc.com/wmsc/upload/file/pdf/v2/lcsc/2304140030_Murata-Electronics-LQW15AN6N2D00D_C703118.pdf; ComponentLink2Description: JLCPCB Part URL; ComponentLink2URL: https://jlcpcb.com/partdetail/C703118; ComponentLink3Description: LCSC Part URL; ComponentLink3URL: https://lcsc.com/product-detail/Power-Inductors_Murata-Electronics-Murata-Electronics-LQW15AN6N2D00D_C703118.html
footprint IND-0402 (0402 (1005M) Inductor)
pins: 1, 2

## LQW15AN6N8G00D
designator L?  Inductance: 6.8nH
Inductor, 6.8nH, ±2%, 90mΩ, 700mA, SMD 0402; Manufacturer: Murata Electronics; Manufacturer Part Number: LQW15AN6N8G00D; Self-Resonant Frequency: 6GHz; Q Factor: 25@250MHz; Package Size: 0402; JLCPCB Basic Part: No; JLCPCB Part Number: C82919; Supplier 1: LCSC; Category: Inductors; Supplier Part Number 1: C82919; Tolerance: ±2%; Rated Current: 700mA; DC Resistance: 90mΩ; RoHS: Yes; ComponentLink1Description: Datasheet; ComponentLink1URL: https://wmsc.lcsc.com/wmsc/upload/file/pdf/v2/lcsc/1811081614_Murata-Electronics-LQW15AN6N8G00D_C82919.pdf; ComponentLink2Description: JLCPCB Part URL; ComponentLink2URL: https://jlcpcb.com/partdetail/C82919; ComponentLink3Description: LCSC Part URL; ComponentLink3URL: https://lcsc.com/product-detail/Inductors-SMD_Murata-Electronics-Murata-Electronics-LQW15AN6N8G00D_C82919.html
footprint IND-0402 (0402 (1005M) Inductor)
pins: 1, 2

## LQW15AN6N8G80D
designator L?  Inductance: 6.8nH
Inductor, 6.8nH, ±2%, 68mΩ, 1.45A, SMD 0402; Manufacturer: Murata Electronics; Manufacturer Part Number: LQW15AN6N8G80D; Self-Resonant Frequency: 7GHz; Q Factor: 30@250MHz; Package Size: 0402; JLCPCB Basic Part: No; JLCPCB Part Number: C882467; Supplier 1: LCSC; Category: Inductors; Supplier Part Number 1: C882467; Tolerance: ±2%; Rated Current: 1.45A; DC Resistance: 68mΩ; RoHS: Yes; ComponentLink1Description: Datasheet; ComponentLink1URL: https://wmsc.lcsc.com/wmsc/upload/file/pdf/v2/lcsc/2201242130_Murata-Electronics-LQW15AN6N8G80D_C882467.pdf; ComponentLink2Description: JLCPCB Part URL; ComponentLink2URL: https://jlcpcb.com/partdetail/C882467; ComponentLink3Description: LCSC Part URL; ComponentLink3URL: https://lcsc.com/product-detail/Inductors-SMD_Murata-Electronics-Murata-Electronics-LQW15AN6N8G80D_C882467.html
footprint IND-0402 (0402 (1005M) Inductor)
pins: 1, 2

## LQW15AN6N8J00D
designator L?  Inductance: 6.8nH
Inductor, 6.8nH, ±5%, 90mΩ, 700mA, SMD 0402; Manufacturer: Murata Electronics; Manufacturer Part Number: LQW15AN6N8J00D; Self-Resonant Frequency: 6GHz; Q Factor: 25@250MHz; Package Size: 0402; JLCPCB Basic Part: No; JLCPCB Part Number: C113119; Supplier 1: LCSC; Category: Inductors; Supplier Part Number 1: C113119; Tolerance: ±5%; Rated Current: 700mA; DC Resistance: 90mΩ; RoHS: Yes; ComponentLink1Description: Datasheet; ComponentLink1URL: https://wmsc.lcsc.com/wmsc/upload/file/pdf/v2/lcsc/2304140030_Murata-Electronics-LQW15AN6N8J00D_C113119.pdf; ComponentLink2Description: JLCPCB Part URL; ComponentLink2URL: https://jlcpcb.com/partdetail/C113119; ComponentLink3Description: LCSC Part URL; ComponentLink3URL: https://lcsc.com/product-detail/Inductors-SMD_Murata-Electronics-Murata-Electronics-LQW15AN6N8J00D_C113119.html
footprint IND-0402 (0402 (1005M) Inductor)
pins: 1, 2

## LQW15AN7N2G00D
designator L?  Inductance: 7.2nH
Inductor, 7.2nH, ±2%, 130mΩ, SMD 0402; Manufacturer: Murata Electronics; Manufacturer Part Number: LQW15AN7N2G00D; Self-Resonant Frequency: 6GHz; Q Factor: 25@250MHz; Package Size: 0402; JLCPCB Basic Part: No; JLCPCB Part Number: C269827; Supplier 1: LCSC; Category: Inductors; Supplier Part Number 1: C269827; Tolerance: ±2%; DC Resistance: 130mΩ; RoHS: Yes; ComponentLink1Description: Datasheet; ComponentLink1URL: https://wmsc.lcsc.com/wmsc/upload/file/pdf/v2/lcsc/2304140030_Murata-Electronics-LQW15AN7N2G00D_C269827.pdf; ComponentLink2Description: JLCPCB Part URL; ComponentLink2URL: https://jlcpcb.com/partdetail/C269827; ComponentLink3Description: LCSC Part URL; ComponentLink3URL: https://lcsc.com/product-detail/Inductors-SMD_Murata-Electronics-Murata-Electronics-LQW15AN7N2G00D_C269827.html
footprint IND-0402 (0402 (1005M) Inductor)
pins: 1, 2

## LQW15AN7N3G00D
designator L?  Inductance: 7.3nH
Inductor, 7.3nH, ±2%, 130mΩ, 570mA, SMD 0402; Manufacturer: Murata Electronics; Manufacturer Part Number: LQW15AN7N3G00D; Self-Resonant Frequency: 6GHz; Q Factor: 25@250MHz; Package Size: 0402; JLCPCB Basic Part: No; JLCPCB Part Number: C167486; Supplier 1: LCSC; Category: Inductors; Supplier Part Number 1: C167486; Tolerance: ±2%; Rated Current: 570mA; DC Resistance: 130mΩ; RoHS: Yes; ComponentLink1Description: Datasheet; ComponentLink1URL: https://wmsc.lcsc.com/wmsc/upload/file/pdf/v2/lcsc/2304140030_Murata-Electronics-LQW15AN7N3G00D_C167486.pdf; ComponentLink2Description: JLCPCB Part URL; ComponentLink2URL: https://jlcpcb.com/partdetail/C167486; ComponentLink3Description: LCSC Part URL; ComponentLink3URL: https://lcsc.com/product-detail/Inductors-SMD_Murata-Electronics-Murata-Electronics-LQW15AN7N3G00D_C167486.html
footprint IND-0402 (0402 (1005M) Inductor)
pins: 1, 2

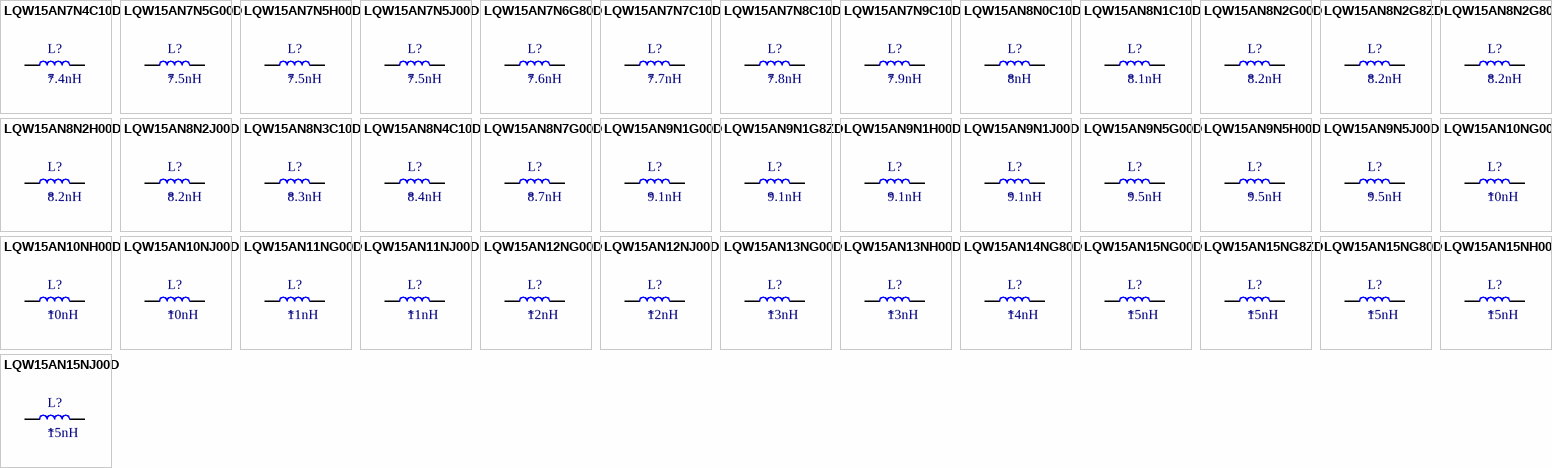
[diagram p14: symbols LQW15AN7N4C10D to LQW15AN15NJ00D]